# Altium footprint library deep_lib.PcbLib: 35 footprints (part 3 of 3)
Each footprint in its own frame and in the unit in brackets; x right, y up, seen from the top. Pads: shape width x height; smd on the part's side, far side on the other; paste and mask are expansions set on the pad; w line width, h text height; cw(c..) or ccw(c..) is an arc to the next point about the centre after c.
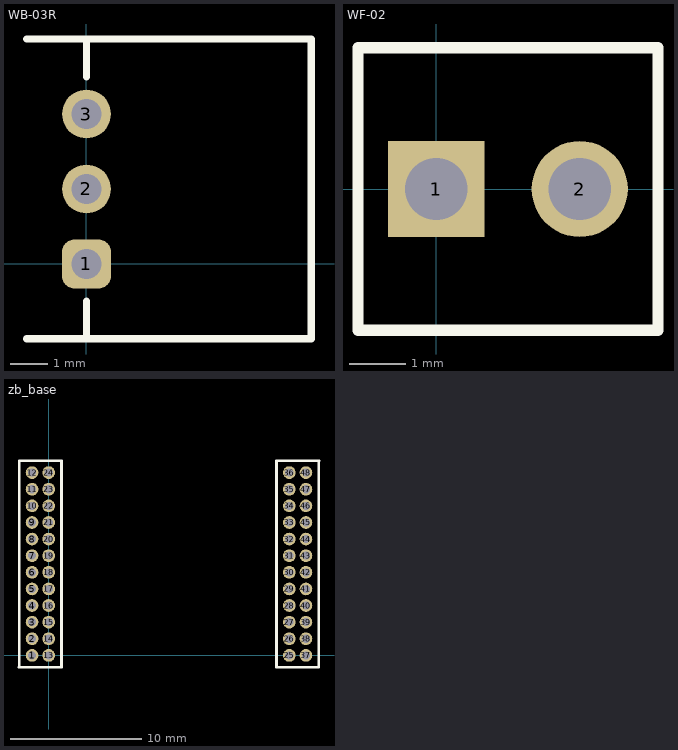
[diagram p2: the footprints below, top view; thin cyan lines are the x and y axes]

## WB-03R [mm]
height 4.75
pads (3):
  rrect50% 1.3x1.3 hole 0.8: 1(0,0)
  round 1.3 hole 0.8: 2(0,2) 3(0,4)
Top Overlay:
  lines w0.2: -1.6,-2 6,-2 6,6 -1.6,6 ; 0,-2 0,-1 ; 0,5 0,6

## WF-02 [mm]
pads (2):
  rect 1.7x1.7 hole 1.1: 1(0,0)
  round 1.7 hole 1.1: 2(2.54,0)
Top Overlay:
  lines w0.2: -1.385,-2.5 -1.385,2.5 3.925,2.5 3.925,0 3.925,-2.5 -1.385,-2.5
3D body: height 11.51, standoff -3.29, extent -1.27,-3.3 3.81,2.5

## zb_base [mm]
pads (48):
  round 0.97 hole 0.62 mask+0.1: 1(-1.27,0) 2(-1.27,1.27) 3(-1.27,2.54) 4(-1.27,3.81) 5(-1.27,5.08) 6(-1.27,6.35) 7(-1.27,7.62) 8(-1.27,8.89) 9(-1.27,10.16) 10(-1.27,11.43) 11(-1.27,12.7) 12(-1.27,13.97) 13(0,0) 14(0,1.27) 15(0,2.54) 16(0,3.81) 17(0,5.08) 18(0,6.35) 19(0,7.62) 20(0,8.89) 21(0,10.16) 22(0,11.43) 23(0,12.7) 24(0,13.97) 25(18.39,0) 26(18.39,1.27) 27(18.39,2.54) 28(18.39,3.81) 29(18.39,5.08) 30(18.39,6.35) 31(18.39,7.62) 32(18.39,8.89) 33(18.39,10.16) 34(18.39,11.43) 35(18.39,12.7) 36(18.39,13.97) 37(19.66,0) 38(19.66,1.27) 39(19.66,2.54) 40(19.66,3.81) 41(19.66,5.08) 42(19.66,6.35) 43(19.66,7.62) 44(19.66,8.89) 45(19.66,10.16) 46(19.66,11.43) 47(19.66,12.7) 48(19.66,13.97)
Top Overlay:
  lines w0.2: -2.27,-0.905 0.98,-0.905 0.98,14.875 1,14.875 -2.25,14.875 -2.25,-0.905 -2.27,-0.905 ; 17.39,-0.905 20.64,-0.905 20.64,14.875 20.66,14.875 17.41,14.875 17.41,-0.905 17.39,-0.905
3D body: height 10.5, standoff -2.4, extent -4.486,-3.632 28.514,17.843